# Altium schematic symbol library SCHLIB.SchLib: 2608 symbols (part 19 of 20) (continued)
## SW-AYZ0202AGRLC (continued)
SWITCH SLIDE DPDT 100MA 12V; Manufacturer: ITT C&K; Manufacturer Part Number: AYZ0202AGRLC; Mechanical Life: 10000Cycles; Actuator Material: Nylon,Glass,Polyamide,Glass fibre; Actuator Type: Standard; Illumination Type: Non-Illuminated; Contact Resistance: 80mR; Switch Function: On-On; Actuator Length: 1mm; Supplier 1: RSComponents; Supplier Part Number 1: 7931504; Stock: 377; Pricing: 1=1.326, 50=1.209, 100=1.105, 1000=1.027, 3000=0.962, 1=10.2, 50=9.3, 100=8.5, 1000=7.9, 3000=7.4 (EUR); RoHS: Yes; Mount: Surface Mount,PCB; Case/Package: 100; Contact Material: Copper Alloy,Brass,Silver; Housing Material: Glass; Contact Plating: Silver; Min Operating Temperature: -10°C; Max Operating Temperature: 60°C; Termination: Gull Wing; Throw Configuration: DPDT; Max Current Rating: 100mA; Max Voltage Rating (DC): 12V; Voltage Rating (DC): 12V; Package Quantity: 1; Packaging: Tape and Reel; Current Rating: 100mA; Contact Current Rating: 100mA; Orientation: Vertical; Length: 7.2mm; Depth: 6mm; Radiation Hardening: No; Lead Free: Lead Free; REACH SVHC: No SVHC; ComponentLink1URL: https://datasheet.ciiva.com/16417/ayz0202agrlc-16417120.pdf?src-supplier=Future+Electronics; ComponentLink1Description: https://datasheet.ciiva.com/16417/ayz0202agrlc-16417120.pdf?src-supplier=Future+Electronics; ComponentLink2URL: https://datasheet.ciiva.com/2889/ayz-16oct13-2889189.pdf?src-supplier=Digi-Key; ComponentLink2Description: https://datasheet.ciiva.com/2889/ayz-16oct13-2889189.pdf?src-supplier=Digi-Key; ComponentLink3URL: https://datasheet.ciiva.com/8624/ayz-16oct13-8624741.pdf?src-supplier=Avnet; ComponentLink3Description: https://datasheet.ciiva.com/8624/ayz-16oct13-8624741.pdf?src-supplier=Avnet; ComponentLink4URL: https://datasheet.ciiva.com/2889/ayz-16oct13-2889190.pdf?src-supplier=Digi-Key; ComponentLink4Description: https://datasheet.ciiva.com/2889/ayz-16oct13-2889190.pdf?src-supplier=Digi-Key; ComponentLink5URL: https://datasheet.ciiva.com/2889/ayz-16oct13-2889191.pdf?src-supplier=Digi-Key; ComponentLink5Description: https://datasheet.ciiva.com/2889/ayz-16oct13-2889191.pdf?src-supplier=Digi-Key; ComponentLink6URL: https://datasheet.ciiva.com/16174/ayz-24mar-16174248.pdf?src-supplier=Onlinecomponents.com; ComponentLink6Description: https://datasheet.ciiva.com/16174/ayz-24mar-16174248.pdf?src-supplier=Onlinecomponents.com; ComponentLink7URL: https://datasheet.ciiva.com/22630/1707705-22630555.pdf?src-supplier=Element14; ComponentLink7Description: https://datasheet.ciiva.com/22630/1707705-22630555.pdf?src-supplier=Element14
footprint SW-AYZ0202AGRLC
pins: 1, 2, 3, 4, 5, 6

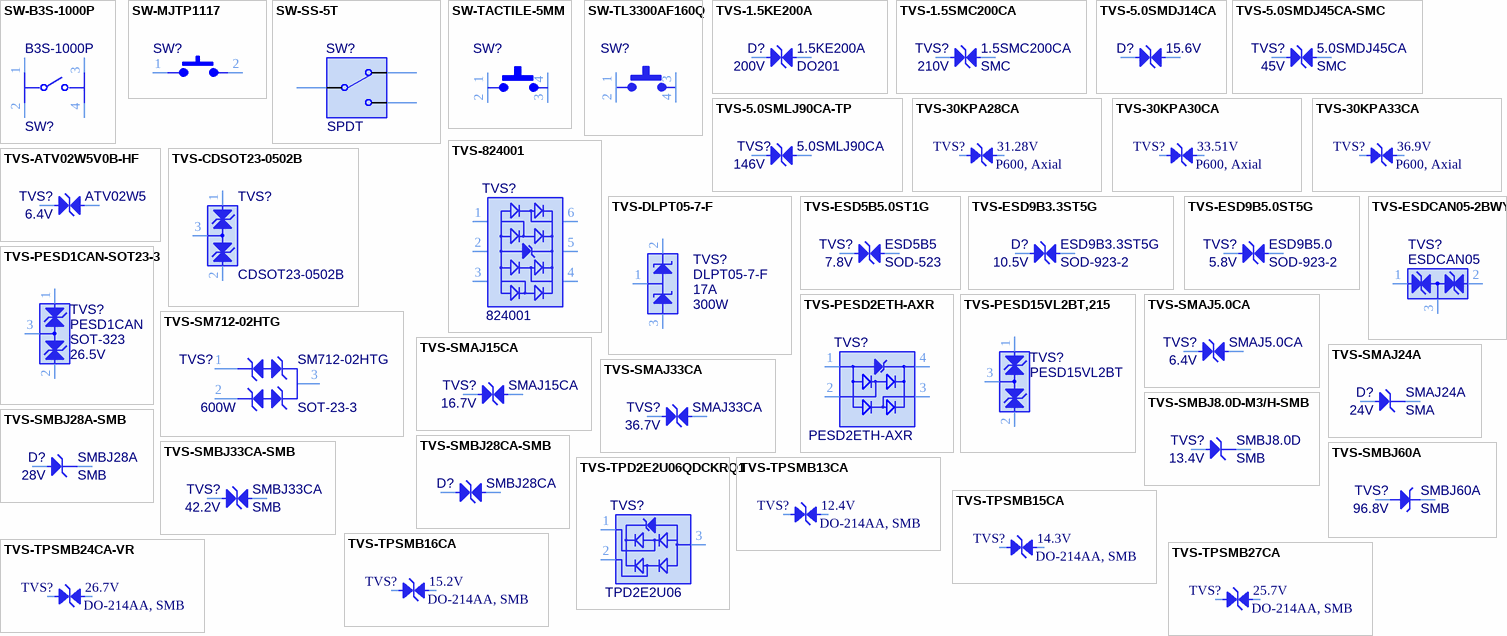
[diagram p82: symbols SW-B3S-1000P to TVS-TPSMB27CA]

## SW-B3S-1000P
designator SW?, comment B3S-1000P
SWITCH TACTILE SPST-NO 0.05A 24V; Manufacturer 1: Omron; Throw Configuration: SPST; Switch Function: Off-Mom; Switch Travel: 0.25mm; Contact Current Rating: 50mA; Actuator Length: 0.8mm; Mechanical Life: 500000Cycles; Contact Resistance: 100mR; Operating Force: 1.57N; Actuator Type: Standard; Illumination Type: Non-Illuminated; Ratings: IP67; Number of Poles: 1; Package Quantity: 1; Orientation: Straight; REACH SVHC: No SVHC; Lead Free: Lead Free; Max Current Rating: 50mA; Contact Plating: Silver; Current Rating: 50mA; Depth: 9mm; Contact Material: Bronze; Electrical Life: 500000Cycles; Termination: Gull Wing; Width: 6mm; Packaging: Tape and Reel; Min Operating Temperature: -25°C; Radiation Hardening: No; Max Voltage Rating (DC): 24V; Max Operating Temperature: 70°C; Length: 6.6mm; Height: 3.65mm; Voltage Rating (DC): 24V; Weight: 0.010582oz; Mount: Surface Mount; Supplier 1: Digi-Key; Manufacturer Part Number: B3S-1000P; Stock 1: 141614; Pricing 1: 1=0,65000, 10=0,63100, 25=0,60640, 100=0,52620, 250=0,48016, 500=0,44620 (USD); RoHS: Yes; ComponentLink1URL: https://datasheet.ciiva.com/2899/b3s-1110-2899873.pdf?src-supplier=Digi-Key; ComponentLink1Description: https://datasheet.ciiva.com/2899/b3s-1110-2899873.pdf?src-supplier=Digi-Key; ComponentLink2URL: https://datasheet.ciiva.com/2899/b3s-1110-2899874.pdf?src-supplier=Digi-Key; ComponentLink2Description: https://datasheet.ciiva.com/2899/b3s-1110-2899874.pdf?src-supplier=Digi-Key; ComponentLink3URL: https://datasheet.ciiva.com/2899/b3s-1110-2899875.pdf?src-supplier=Digi-Key; ComponentLink3Description: https://datasheet.ciiva.com/2899/b3s-1110-2899875.pdf?src-supplier=Digi-Key; ComponentLink4URL: https://datasheet.ciiva.com/15183/getdatasheetpartid-211358-15183771.pdf?src-supplier=Verical; ComponentLink4Description: https://datasheet.ciiva.com/15183/getdatasheetpartid-211358-15183771.pdf?src-supplier=Verical; ComponentLink5URL: https://datasheet.ciiva.com/27056/2086750-27056652.pdf?src-supplier=Jameco; ComponentLink5Description: https://datasheet.ciiva.com/27056/2086750-27056652.pdf?src-supplier=Jameco; ComponentLink6URL: https://datasheet.ciiva.com/16155/en-b3s-16155006.pdf?src-supplier=Onlinecomponents.com; ComponentLink6Description: https://datasheet.ciiva.com/16155/en-b3s-16155006.pdf?src-supplier=Onlinecomponents.com; ComponentLink7URL: https://datasheet.ciiva.com/30125/en-b3s-30125455.pdf?src-supplier=Onlinecomponents.com; ComponentLink7Description: https://datasheet.ciiva.com/30125/en-b3s-30125455.pdf?src-supplier=Onlinecomponents.com; Supplier Part Number 1: SW836CT-ND
footprint CON-FP-B3S-1000P-MFG
pins: 1, 2, 3, 4

## SW-MJTP1117
designator SW?  (value not drawn)
SWITCH TACTILE SPST-NO 0.05A 12V; Manufacturer: APEM; Manufacturer Part Number: MJTP1117; Mechanical Life: 100000Cycles; Actuator Material: Thermoplastic; Operating Force: 180gf; Throw Configuration: SPST; Contact Resistance: 100mR; Current Rating: 50mA; Illumination Type: Non-Illuminated; Switch Travel: 0.25mm; Switch Function: Off-Mom; Actuator Length: 1.45mm; Washability: OK; Supplier 1: Digi-Key; Stock 1: 34701; Pricing 1: 1=0.45, 50=0.4106, 100=0.3542, 500=0.3059, 1000=0.2415, 5000=0.2254 (USD); Mount: Through Hole; Contact Material: Bronze,Stainless Steel; Contact Plating: Silver; Min Operating Temperature: -20°C; Max Operating Temperature: 70°C; Package Quantity: 100; Packaging: Bulk; Voltage Rating (DC): 12V; Max Voltage Rating (DC): 12V; Termination: PC Pin; Electrical Life: 100000Cycles; Orientation: Right Angle; Supplier Part Number 1: 679-2400-ND
pins: 1, 2

## SW-SS-5T
designator SW?, comment SPDT
SWITCH SNAP ACTION SPDT 5A 125V; Manufacturer: Omron; Manufacturer Part Number: SS-5T; Mechanical Life: 30000000Cycles; Operating Force: 1.47N; Voltage Rating (DC): 30V; Max Voltage Rating (DC): 14V; Current Rating: 4A; Electrical Life: 200000Cycles; Number of Poles: 1; Pretravel: 0.02inch; Differential Travel: 0.004inch; Operating Position: 0.33inch; Switch Function: On-Mom; Ratings: IP40; Approvals: CSA,UL; Washability: OK; Supplier 1: Digi-Key; Supplier Part Number 1: SW141-ND; Stock 1: 4164; Pricing 1: 1=2.2, 10=2.035, 25=1.908, 50=1.8658, 100=1.4841, 250=1.39932, 500=1.3145, 1000=1.2297, 5000=1.14489 (USD); Mount: Chassis Mount,Screw; Case/Package: 125; Weight: 1.6g; Contact Material: Silver; Min Operating Temperature: -25°C; Max Operating Temperature: 85°C; Max Current Rating: 5A; Voltage Rating (AC): 125V; Max Voltage Rating (AC): 125V; Throw Configuration: SPDT; Package Quantity: 500; Contact Current Rating: 5A; Packaging: Bulk; Termination: Quick Connect; Orientation: Straight; Overtravel: 0.02inch; Length: 19.8mm; Depth: 6.4mm; REACH SVHC: Unknown; Lead Free: Lead Free; ComponentLink1URL: http://www.omron.com/ecb/products/pdf/en-ss.pdf?src-supplier=Digi-Key; ComponentLink1Description: http://www.omron.com/ecb/products/pdf/en-ss.pdf?src-supplier=Digi-Key; ComponentLink2URL: https://www.distrelec.biz/Web/Downloads/24/01/03572401.pdf?mime=application%2Fpdf&src-supplier=Distrelec; ComponentLink2Description: https://www.distrelec.biz/Web/Downloads/24/01/03572401.pdf?mime=application%2Fpdf&src-supplier=Distrelec; ComponentLink3URL: https://www.components.omron.com/components/web/pdflib.nsf/0/80FC48E7A8A557A885257201007DD493/$file/SS_1110.pdf?src-supplier=Avnet; ComponentLink3Description: https://www.components.omron.com/components/web/pdflib.nsf/0/80FC48E7A8A557A885257201007DD493/$file/SS_1110.pdf?src-supplier=Avnet; ComponentLink4URL: https://www.alliedelec.com/m/d/4bac659ac71603589768c71b5ea7cc57.pdf?src-supplier=Allied+Electronics; ComponentLink4Description: https://www.alliedelec.com/m/d/4bac659ac71603589768c71b5ea7cc57.pdf?src-supplier=Allied+Electronics
footprint SPDT-SS5T
pins: C COM, NC, NO

## SW-TACTILE-5MM
designator SW?
SWITCH TACTILE SPST-NO 0.05A 24V; Manufacturer: TE Connectivity AMP; Manufacturer Part Number: FSM4JSMA; Mechanical Life: 100000Cycles; Actuator Material: Polyamide; Operating Force: 1.57N; Throw Configuration: SPST; Max Voltage Rating (DC): 12V; Current Rating: 50mA; Illumination Type: Illuminated,Non-Illuminated; Contact Resistance: 100mR; Switch Travel: 0.25mm; Switch Function: Off-Mom; Actuator Type: Standard; Actuator Length: 0.055inch; Washability: OK; Supplier 1: Digi-Key; Stock 1: 31344; Pricing 1: 1=0.23, 10=0.218, 25=0.2108, 50=0.2032, 100=0.192, 250=0.18068, 500=0.17314, 1000=0.13174, 5000=0.10916 (USD); Mount: Surface Mount; Case/Package: SMA; Contact Material: Copper Alloy; Contact Plating: Silver; Min Operating Temperature: -35°C; Max Operating Temperature: 85°C; Voltage Rating (DC): 24V; Packaging: Loose Piece; Termination: Gull Wing; Orientation: Straight; Package Quantity: 750; Contact Current Rating: 50mA; Electrical Life: 100000Cycles; Voltage Rating: 24V; Type: Switch; Length: 6mm; Width: 6mm; REACH SVHC: Unknown; ComponentLink1URL: https://www.alliedelec.com/m/d/12a87fa7d0b178a96761783f66d58fa4.pdf; ComponentLink1Description: https://www.alliedelec.com/m/d/12a87fa7d0b178a96761783f66d58fa4.pdf; ComponentLink2URL: http://www.onlinecomponents.com/productFiles/mf-AO/eng_cat_1308390_0904_e3_e10_.pdf; ComponentLink2Description: http://www.onlinecomponents.com/productFiles/mf-AO/eng_cat_1308390_0904_e3_e10_.pdf; ComponentLink3URL: https://www.te.com/commerce/DocumentDelivery/DDEController?Action=srchrtrv&DocNm=1308111-1_SWITCHES_CORE_PROGRAM_CATALOG&DocType=CS&DocLang=English; ComponentLink3Description: https://www.te.com/commerce/DocumentDelivery/DDEController?Action=srchrtrv&DocNm=1308111-1_SWITCHES_CORE_PROGRAM_CATALOG&DocType=CS&DocLang=English; Supplier Part Number 1: 450-1129-ND
pins: 1, 2, 3, 4

## SW-TL3300AF160Q
designator SW?
SWITCH TACTILE SPST-NO 0.05A 12V; Manufacturer: E-Switch; Manufacturer Part Number: DTSMW-24R-Q-T/R; Mechanical Life: 200000Cycles; Switch Function: Off-Mom; Throw Configuration: SPST; Illumination Type: Non-Illuminated; Current Rating: 50mA; Operating Force: 160gf; Switch Travel: 0.35mm; Supplier 1: Digi-Key; Supplier Part Number 1: EG4902CT-ND; Stock: 6931; Pricing: 1=0.6, 10=0.582, 25=0.5604, 100=0.4851, 250=0.442 (USD); RoHS: Yes; Mount: Surface Mount; Case/Package: SMD/SMT; Contact Plating: Silver; Min Operating Temperature: -25°C; Max Operating Temperature: 70°C; Termination: Gull Wing; Package Quantity: 1; Packaging: Tape and Reel; Voltage Rating (DC): 12V; ComponentLink1URL: https://datasheet.ciiva.com/2900/n301106b-2900869.pdf?src-supplier=Digi-Key; ComponentLink1Description: https://datasheet.ciiva.com/2900/n301106b-2900869.pdf?src-supplier=Digi-Key; ComponentLink2URL: https://datasheet.ciiva.com/2900/n301106b-2900870.pdf?src-supplier=Digi-Key; ComponentLink2Description: https://datasheet.ciiva.com/2900/n301106b-2900870.pdf?src-supplier=Digi-Key; ComponentLink3URL: https://datasheet.ciiva.com/2900/n301106b-2900871.pdf?src-supplier=Digi-Key; ComponentLink3Description: https://datasheet.ciiva.com/2900/n301106b-2900871.pdf?src-supplier=Digi-Key
footprint TACTILE-TL3300
pins: 1, 2, 3, 4

## TVS-1.5KE200A
designator D?, comment 1.5KE200A  Package: DO201  Voltage Rating (DC): 200V
TVS DIODE 171VWM 353VC DO201; Manufacturer: STMicroelectronics; Max Surge Current: 1mA; Reverse Breakdown Voltage: 190V; Number of Elements: 1; Reverse Standoff Voltage: 171V; Clamping Voltage: 353V; Peak Pulse Power: 1.5kW; Peak Pulse Current: 28A; Leakage Current: 1uA; Power Line Protection: No; Direction: Unidirectional; Element Configuration: Single; Max Breakdown Voltage: 210V; Capacitance: 675pF; Washability: OK; Supplier 1: Digi-Key; Manufacturer Part Number: 1.5KE200A; Stock 1: 1803; Pricing 1: 1=0.71, 10=0.628, 100=0.4816 (USD); Mount: Through Hole; Number of Pins: 2; Min Operating Temperature: -65°C; Max Operating Temperature: 175°C; Package Quantity: 600; Packaging: Tape and Reel; Min Breakdown Voltage: 190V; Breakdown Voltage: 190V; Termination: Through Hole; Test Current: 1mA; Number of Unidirectional Channels: 1; Composition: Zener; Operating Supply Voltage: 171V; Max Reverse Leakage Current: 1uA; Max Power Dissipation: 1.5kW; Power Dissipation: 1.5kW; Diameter: 5.3mm; Length: 9.5mm; Height: 5.3mm; Width: 5.3mm; Radiation Hardening: No; Lead Free: Lead Free; REACH SVHC: No SVHC; ComponentLink1URL: http://www.farnell.com/datasheets/1689681.pdf; ComponentLink1Description: http://www.farnell.com/datasheets/1689681.pdf; ComponentLink2URL: https://www.verical.com/server-webapp/html/getDatasheet?partID=71673; ComponentLink2Description: https://www.verical.com/server-webapp/html/getDatasheet?partID=71673; ComponentLink3URL: http://www.st.com/content/ccc/resource/technical/document/datasheet/03/7a/4e/3b/96/c3/4e/37/CD00000663.pdf/files/CD00000663.pdf/jcr:content/translations/en.CD00000663.pdf; ComponentLink3Description: http://www.st.com/content/ccc/resource/technical/document/datasheet/03/7a/4e/3b/96/c3/4e/37/CD00000663.pdf/files/CD00000663.pdf/jcr:content/translations/en.CD00000663.pdf; ComponentLink4URL: http://www.st.com/web/en/resource/technical/document/datasheet/CD00000663.pdf; ComponentLink4Description: http://www.st.com/web/en/resource/technical/document/datasheet/CD00000663.pdf; ComponentLink5URL: http://www.alliedelec.com/images/products/datasheets/bm/STMICROELECTRONICS/70013809.pdf; ComponentLink5Description: http://www.alliedelec.com/images/products/datasheets/bm/STMICROELECTRONICS/70013809.pdf; ComponentLink6URL: http://www.produktinfo.conrad.com/datenblaetter/1100000-1199999/001184202-da-01-en-TRANSIL_1500W_200V_1_5KE200A_DO_201_STM.pdf; ComponentLink6Description: http://www.produktinfo.conrad.com/datenblaetter/1100000-1199999/001184202-da-01-en-TRANSIL_1500W_200V_1_5KE200A_DO_201_STM.pdf; Supplier Part Number 1: 497-6644-1-ND; Polarity: Unidirectional
footprint D-DO-201-H
pins: A, C

## TVS-1.5SMC200CA
designator TVS?, comment 1.5SMC200CA  Max Breakdown Voltage: 210V  Package: SMC
TVS DIODE 171V 274V DO214AB; Manufacturer: Littelfuse; Peak Pulse Power: 1.5kW; Peak Pulse Current: 5.5A; Polarity: Bidirectional; Min Breakdown Voltage: 190V; Number of Channels: 1; Test Current: 1mA; Power Line Protection: No; Leakage Current: 1uA; Voltage Rating (DC): 200V; Washability: OK; Supplier 1: Mouser; Manufacturer Part Number: 1.5SMC200CA; Stock 1: 2945; Pricing 1: 1=0,72000, 10=0,56300, 100=0,42700, 500=0,38400, 1000=0,29100, 3000=0,27500 (USD); RoHS: Yes; Mount: Surface Mount; Number of Pins: 2; Min Operating Temperature: -55°C; Max Operating Temperature: 150°C; Clamping Voltage: 274V; Packaging: Tape and Reel; Reverse Standoff Voltage: 171V; Breakdown Voltage: 190V; Package Quantity: 3000; Operating Supply Voltage: 171V; Max Surge Current: 5.5A; Direction: Bidirectional; Composition: Zener; Number of Bidirectional Channels: 1; Number of Elements: 1; Reverse Breakdown Voltage: 190V; Termination: SMD/SMT; Power Dissipation: 1.5kW; Length: 8.13mm; Height: 2.62mm; Width: 6.22mm; Lead Free: Lead Free; ComponentLink1URL: https://datasheet.ciiva.com/341/littelfuse-tvs-diode-1-5smc-datasheet-pdf-341221.pdf?src-supplier=Digi-Key; ComponentLink1Description: https://datasheet.ciiva.com/341/littelfuse-tvs-diode-1-5smc-datasheet-pdf-341221.pdf?src-supplier=Digi-Key; ComponentLink2URL: https://datasheet.ciiva.com/6574/littelfuse-tvs-diode-1-5smc-datasheet-pdf-6574613.pdf?src-supplier=Digi-Key; ComponentLink2Description: https://datasheet.ciiva.com/6574/littelfuse-tvs-diode-1-5smc-datasheet-pdf-6574613.pdf?src-supplier=Digi-Key; ComponentLink3URL: https://datasheet.ciiva.com/341/littelfuse-tvs-diode-1-5smc-datasheet-pdf-341222.pdf?src-supplier=Digi-Key; ComponentLink3Description: https://datasheet.ciiva.com/341/littelfuse-tvs-diode-1-5smc-datasheet-pdf-341222.pdf?src-supplier=Digi-Key; Supplier Part Number 1: 576-1.5SMC200CA
footprint D-SMC-DO214AB-CA
pins: A, C

## TVS-5.0SMDJ14CA
designator D?, comment Min Breakdown Voltage: 15.6V  (hidden comment: 5.0SMDJ14CA)
TVS DIODE 14V 23.2V DO214AB; Manufacturer: Littelfuse; Number of Bidirectional Channels: 1; Peak Pulse Power: 5kW; Power Line Protection: No; Peak Pulse Current: 216A; Polarity: Bidirectional; Test Current: 10mA; Leakage Current: 400uA; Washability: OK; Supplier 1: Digi-Key; Manufacturer Part Number: 5.0SMDJ14CA; Stock 1: 2844; Pricing 1: 1=1.90000, 10=1.70600, 25=1.60960, 100=1.25540, 250=1.22324, 500=1.06228, 1000=0.90132 (USD); RoHS: Yes; Mount: Surface Mount; Number of Pins: 2; Min Operating Temperature: -55°C; Max Operating Temperature: 150°C; Reverse Standoff Voltage: 14V; Clamping Voltage: 23.2V; Composition: Zener; Package Quantity: 1; Packaging: Tape and Reel; Operating Supply Voltage: 14V; Max Surge Current: 216A; Reverse Breakdown Voltage: 15.6V; Breakdown Voltage: 15.6V; Number of Channels: 1; Termination: SMD/SMT; Number of Elements: 1; Max Power Dissipation: 5kW; Lead Free: Lead Free; ComponentLink1URL: https://datasheet.ciiva.com/341/littelfuse-tvs-diode-5-0smdj-datasheet-pdf-341407.pdf?src-supplier=Digi-Key; ComponentLink1Description: https://datasheet.ciiva.com/341/littelfuse-tvs-diode-5-0smdj-datasheet-pdf-341407.pdf?src-supplier=Digi-Key; ComponentLink2URL: https://datasheet.ciiva.com/341/littelfuse-tvs-diode-5-0smdj-datasheet-pdf-341406.pdf?src-supplier=Digi-Key; ComponentLink2Description: https://datasheet.ciiva.com/341/littelfuse-tvs-diode-5-0smdj-datasheet-pdf-341406.pdf?src-supplier=Digi-Key; Supplier Part Number 1: F6610CT-ND
footprint D-SMC-DO214AB-CA
pins: A 2, C 1

## TVS-5.0SMDJ45CA-SMC
designator TVS?, comment 5.0SMDJ45CA  Reverse Standoff Voltage: 45V  Package / Case: SMC
TVS DIODE 45VWM 72.7VC SMD; Manufacturer: Littelfuse; Reverse Breakdown Voltage: 50V; Max Surge Current: 66.8A; Number of Bidirectional Channels: 1; Clamping Voltage: 72.7V; Peak Pulse Power: 5kW; Power Line Protection: No; Polarity: Bidirectional; Peak Pulse Current: 68.8A; Test Current: 1mA; Max Breakdown Voltage: 55.3V; Leakage Current: 5uA; Voltage Rating (DC): 28V; Direction: Unidirectional; Max Reverse Leakage Current: 1uA; Power Dissipation: 600W; Element Configuration: Single; Washability: OK; Supplier 1: Digi-Key; Supplier Part Number 1: F4124CT-ND; Manufacturer Part Number: 5.0SMDJ45CA; Stock 1: 12513; Pricing 1: 1=3.03, 10=2.735, 25=2.4416, 100=2.1976, 250=1.95336, 500=1.7092, 1000=1.4162 (USD); Mount: Surface Mount; Number of Pins: 2; Min Operating Temperature: -55°C; Max Operating Temperature: 150°C; Packaging: Tape and Reel; Package Quantity: 3000; Min Breakdown Voltage: 50V; Breakdown Voltage: 50V; Number of Channels: 1; Termination: SMD/SMT; Number of Elements: 1; Composition: Zener; REACH SVHC: Unknown; Lead Free: Lead Free; ComponentLink1URL: http://www.littelfuse.com/products/tvs-diodes/surface-mount/~/media/electronics/datasheets/tvs_diodes/littelfuse_tvs_diode_5_0smdj_datasheet.pdf.pdf; ComponentLink1Description: http://www.littelfuse.com/products/tvs-diodes/surface-mount/~/media/electronics/datasheets/tvs_diodes/littelfuse_tvs_diode_5_0smdj_datasheet.pdf.pdf; Case/Package: SMB; Number of Unidirectional Channels: 1; Max Power Dissipation: 600W; Current: 1mA; Voltage: 28V; Length: 4.57mm; Height: 2.237mm; Width: 3.94mm; Radiation Hardening: No; ComponentLink2URL: http://www.littelfuse.com/~/media/electronics/datasheets/tvs_diodes/littelfuse_tvs_diode_smbj_datasheet.pdf.pdf; ComponentLink2Description: http://www.littelfuse.com/~/media/electronics/datasheets/tvs_diodes/littelfuse_tvs_diode_smbj_datasheet.pdf.pdf; ComponentLink3URL: http://www.farnell.com/datasheets/13057.pdf; ComponentLink3Description: http://www.farnell.com/datasheets/13057.pdf; Weight: 0.00328oz; ComponentLink4URL: http://www.littelfuse.com/data/en/Data_Sheets/Littelfuse_TVS-Diode_SMBJ.pdf; ComponentLink4Description: http://www.littelfuse.com/data/en/Data_Sheets/Littelfuse_TVS-Diode_SMBJ.pdf; ComponentLink5URL: https://www.distrelec.biz/Web/Downloads/g_/ds/smbj_eng_ds.pdf?mime=application%2Fpdf; ComponentLink5Description: https://www.distrelec.biz/Web/Downloads/g_/ds/smbj_eng_ds.pdf?mime=application%2Fpdf; Operating Supply Voltage: 45V
footprint D-SMC-DO214AB-CA
pins: 1 I/O1, 2 I/O2

## TVS-5.0SMLJ90CA-TP
designator TVS?, comment 5.0SMLJ90CA  Clamping Voltage: 146V
TVS DIODE 90V 146V DO214AB; Manufacturer: MCC; Manufacturer Part Number: 5.0SMLJ90CA-TP; Max Surge Current: 34.3A; Number of Channels: 1; Polarity: Bidirectional; Breakdown Voltage: 111V; Peak Pulse Power: 5kW; Min Breakdown Voltage: 100V; Power Line Protection: No; Supplier 1: Digi-Key; Stock 1: 2842; Pricing 1: 1=1,71000, 10=1,45000, 100=1,10200, 500=0,95700, 1000=0,80040 (USD); RoHS: Yes; Mount: Surface Mount; Min Operating Temperature: -55°C; Max Operating Temperature: 175°C; Packaging: Tape and Reel; Package Quantity: 3000; Peak Pulse Current: 34.3A; Termination: SMD/SMT; Number of Bidirectional Channels: 1; Reverse Standoff Voltage: 90V; Resistor Type: Zener; ComponentLink1URL: http://www.mouser.com/ds/2/258/5.0SMLJ11A-5.0SMLJ170A(LSMC)-220449.pdf?src-supplier=Mouser; ComponentLink1Description: http://www.mouser.com/ds/2/258/5.0SMLJ11A-5.0SMLJ170A(LSMC)-220449.pdf?src-supplier=Mouser; ComponentLink2URL: http://www.mccsemi.com/up_pdf/5.0SMLJ11A-5.0SMLJ400A(LSMC)-J.pdf?src-supplier=Digi-Key; ComponentLink2Description: http://www.mccsemi.com/up_pdf/5.0SMLJ11A-5.0SMLJ400A(LSMC)-J.pdf?src-supplier=Digi-Key; Supplier Part Number 1: 5.0SMLJ90CA-TPMSCT-ND
footprint D-SMC-DO214AB
pins: A, C

## TVS-30KPA28CA
designator TVS?  Voltage - Breakdown (Min): 31.28V  Package: P600, Axial
TVS DIODE 28VWM 50VC P600; Manufacturer Part Number: 30KPA28CA; Manufacturer: Littelfuse Inc.; Bidirectional Channels: 1; Voltage - Reverse Standoff: 28V; Voltage - Clamping (Max) @ Ipp: 50V; Current - Peak Pulse (10/1000µs): 606A; Power - Peak Pulse: 30000W (30kW); Power Line Protection: No; Object  Type: Part; Design Item ID: TVS-30KPA28CA; Series: 30KPA; Type: Zener; Applications: General Purpose; Operating Temperature: -55°C ~ 175°C (TJ); Mounting Type: Through Hole; Category: Diode
footprint DO-204AP-P600
pins: A I/O1, C I/O2

## TVS-30KPA30CA
designator TVS?  Voltage - Breakdown (Min): 33.51V  Package: P600, Axial
TVS DIODE 30VWM 55.2VC P600; Manufacturer Part Number: 30KPA30CA; Manufacturer: Littelfuse Inc.; Bidirectional Channels: 1; Voltage - Reverse Standoff: 30V; Voltage - Clamping (Max) @ Ipp: 55.2V; Current - Peak Pulse (10/1000µs): 548.9A; Power - Peak Pulse: 30000W (30kW); Power Line Protection: No; Object  Type: Part; Design Item ID: TVS-30KPA30CA; Series: 30KPA; Type: Zener; Applications: General Purpose; Operating Temperature: -55°C ~ 175°C (TJ); Mounting Type: Through Hole; Category: Diode
footprint DO-204AP-P600
pins: A I/O1, C I/O2

## TVS-30KPA33CA
designator TVS?  Voltage - Breakdown (Min): 36.9V  Package: P600, Axial
TVS DIODE 33VWM 58.5VC P600; Manufacturer Part Number: 30KPA33CA; Manufacturer: Littelfuse Inc.; Bidirectional Channels: 1; Voltage - Reverse Standoff: 33V; Voltage - Clamping (Max) @ Ipp: 58.5V; Current - Peak Pulse (10/1000µs): 517.9A; Power - Peak Pulse: 30000W (30kW); Power Line Protection: No; Object  Type: Part; Design Item ID: TVS-30KPA33CA; Series: 30KPA; Type: Zener; Applications: General Purpose; Operating Temperature: -55°C ~ 175°C (TJ); Mounting Type: Through Hole; Category: Diode
footprint DO-204AP-P600
pins: A I/O1, C I/O2

## TVS-824001
designator TVS?, comment 824001
TVS DIODE 5V 9V SOT23-6L; Manufacturer: Wurth Electronics; Capacitance: 1pF; Direction: Unidirectional; Polarity: Bidirectional; Number of Bidirectional Channels: 4; Min Breakdown Voltage: 6.2V; Power Line Protection: Yes; Max Reverse Leakage Current: 2A; Test Current: 1mA; Max Surge Current: 5A; Operating Supply Voltage: 6V; Supplier 1: Digi-Key; Supplier Part Number 1: 732-4464-1-ND; Manufacturer Part Number: 824001; Stock: 1126; Pricing: 1=0.74, 10=0.706, 50=0.659, 100=0.612, 500=0.541 (USD); RoHS: Yes; Mount: Surface Mount; Case/Package: SOT-23; Number of Pins: 6; Min Operating Temperature: -55°C; Max Operating Temperature: 85°C; Package Quantity: 3000; Termination: SMD/SMT; Packaging: Tape and Reel; Working Voltage: 5V; Reverse Standoff Voltage: 5V; Clamping Voltage: 9V; ESD Protection: Yes; Max Breakdown Voltage: 6.2V; Breakdown Voltage: 6.2V; Number of Channels: 4; Peak Pulse Current: 5A; Length: 2.9mm; Height: 1.16mm; Width: 2.8mm; REACH SVHC: Unknown; Lead Free: Lead Free; ComponentLink1URL: https://datasheet.ciiva.com/22694/824001-22694065.pdf?src-supplier=Element14; ComponentLink1Description: https://datasheet.ciiva.com/22694/824001-22694065.pdf?src-supplier=Element14; ComponentLink2URL: https://datasheet.ciiva.com/15063/824001-15063556.pdf?src-supplier=Digi-Key; ComponentLink2Description: https://datasheet.ciiva.com/15063/824001-15063556.pdf?src-supplier=Digi-Key; ComponentLink3URL: https://datasheet.ciiva.com/15063/824001-15063557.pdf?src-supplier=Digi-Key; ComponentLink3Description: https://datasheet.ciiva.com/15063/824001-15063557.pdf?src-supplier=Digi-Key; ComponentLink4URL: https://datasheet.ciiva.com/15063/824001-15063558.pdf?src-supplier=Digi-Key; ComponentLink4Description: https://datasheet.ciiva.com/15063/824001-15063558.pdf?src-supplier=Digi-Key; ComponentLink5URL: https://datasheet.ciiva.com/1276/824001-1276087.pdf?src-supplier=Element14; ComponentLink5Description: https://datasheet.ciiva.com/1276/824001-1276087.pdf?src-supplier=Element14
footprint SOT23-6L
pins: 1 I/O1, 2 GND, 3 I/O2, 4 I/O3, 5 VDD, 6 I/O4

## TVS-ATV02W5V0B-HF
designator TVS?, comment ATV02W5  Min Breakdown Voltage: 6.4V
TVS DIODE 5V 9.2V SOD123; Manufacturer: Comchip; Manufacturer Part Number: ATV02W5V0B-HF; Number of Bidirectional Channels: 1; Peak Pulse Power: 200W; Power Line Protection: No; Peak Pulse Current: 21.74A; Washability: OK; Supplier 1: Digi-Key; Supplier Part Number 1: 641-1986-1-ND; Stock 1: 7901; Pricing 1: 1=0.37000, 10=0.30000, 25=0.27440, 100=0.17240, 250=0.17052, 500=0.15966, 1000=0.10856 (USD); RoHS: Yes; Mount: Surface Mount; Case/Package: SOD123F; Min Operating Temperature: -55°C; Max Operating Temperature: 150°C; Packaging: Tape and Reel; Reverse Standoff Voltage: 5V; Clamping Voltage: 9.2V; Package Quantity: 3000; Composition: Zener; ComponentLink1URL: http://www.mouser.com/ds/2/80/ATV02W-HF series RevB-769696.pdf?src-supplier=Mouser; ComponentLink1Description: http://www.mouser.com/ds/2/80/ATV02W-HF series RevB-769696.pdf?src-supplier=Mouser; ComponentLink2URL: http://www.comchiptech.com/cms/UserFiles/ATV02W-HF%20series%20RevA.pdf?src-supplier=Digi-Key; ComponentLink2Description: http://www.comchiptech.com/cms/UserFiles/ATV02W-HF%20series%20RevA.pdf?src-supplier=Digi-Key
pins: A, C

## TVS-CDSOT23-0502B
designator TVS?, comment CDSOT23-0502B
TVS DIODE 5V 9V SOT23-3L; Manufacturer 1: Bourns; Direction: Bidirectional; Max Surge Current: 8.5A; Number of Channels: 2; Breakdown Voltage: 6V; Power Line Protection: No; Leakage Current: 2.5uA; Element Configuration: Dual; Capacitance: 15pF; Washability: OK; Supplier 1: Digi-Key; Manufacturer Part Number 1: CDSOT23-0502B; Stock 1: 34895; Pricing 1: 1=0,63000, 10=0,54100, 25=0,50480, 100=0,37490, 250=0,35616, 500=0,29272, 1000=0,23793 (USD); RoHS: Yes; Mount: Surface Mount; Case/Package: SOT-23; Number of Pins: 3; Contact Plating: Tin,Matte; Min Operating Temperature: -55°C; Max Operating Temperature: 125°C; Package Quantity: 3000; Packaging: Tape and Reel; Polarity: Bidirectional; Reverse Standoff Voltage: 5V; Clamping Voltage: 9V; Termination: SMD/SMT; Min Breakdown Voltage: 6V; Peak Pulse Current: 8.5A; Composition: Zener; Working Voltage: 5V; Number of Bidirectional Channels: 2; Depth: 1.4mm; Radiation Hardening: No; REACH SVHC: No SVHC; ComponentLink1URL: https://datasheet.ciiva.com/11193/cdsot23-0502b-11193841.pdf?src-supplier=Avnet; ComponentLink1Description: https://datasheet.ciiva.com/11193/cdsot23-0502b-11193841.pdf?src-supplier=Avnet; ComponentLink2URL: https://datasheet.ciiva.com/4510/cdsot23-0502b-63869-4510207.pdf?src-supplier=Mouser; ComponentLink2Description: https://datasheet.ciiva.com/4510/cdsot23-0502b-63869-4510207.pdf?src-supplier=Mouser; Supplier Part Number 1: CDSOT23-0502BCT-ND
footprint SOT23-3
pins: 1 I/O1, 2 I/O2, 3 GND (power)

## TVS-DLPT05-7-F
designator TVS?, comment DLPT05-7-F  Max Power Dissipation: 300W  Max Surge Current: 17A
TVS DIODE 5VWM 9.8VC SOT23-3; Manufacturer 1: Diodes; Direction: Unidirectional; Clamping Voltage: 9.8V; Working Voltage: 5V; Capacitance: 1.9pF; Number of Elements: 1; Reverse Breakdown Voltage: 6V; Power Line Protection: Yes; Number of Channels: 2; Leakage Current: 20uA; Test Current: 1mA; Element Configuration: Single; Washability: OK; Supplier 1: Digi-Key; Manufacturer Part Number 1: DLPT05-7-F; Stock 1: 134366; Pricing 1: 1=0,38000, 10=0,28500, 100=0,13570, 500=0,12028, 1000=0,09360 (USD); RoHS: Yes; Mount: Surface Mount; Case/Package: SOT-23-3; Number of Pins: 3; Contact Plating: Tin,Matte; Min Operating Temperature: -55°C; Max Operating Temperature: 150°C; Package Quantity: 3000; Packaging: Tape and Reel; Number of Bidirectional Channels: 1; Reverse Standoff Voltage: 5V; Min Breakdown Voltage: 6V; Peak Pulse Power: 300W; Polarity: Unidirectional; Termination: SMD/SMT; Breakdown Voltage: 6V; Power Dissipation: 300W; Peak Pulse Current: 17A; ESD Protection: Yes; Max Reverse Leakage Current: 20uA; Voltage Rating (DC): 6V; Length: 1.3mm; Height: 1mm; Width: 2.9mm; Depth: 1.3mm; Radiation Hardening: No; REACH SVHC: No SVHC; Lead Free: Lead Free; ComponentLink1URL: https://datasheet.ciiva.com/334/ds30310-334816.pdf?src-supplier=Digi-Key; ComponentLink1Description: https://datasheet.ciiva.com/334/ds30310-334816.pdf?src-supplier=Digi-Key; ComponentLink2URL: https://datasheet.ciiva.com/15143/getdatasheetpartid-40673-15143067.pdf?src-supplier=Verical; ComponentLink2Description: https://datasheet.ciiva.com/15143/getdatasheetpartid-40673-15143067.pdf?src-supplier=Verical; ComponentLink3URL: https://datasheet.ciiva.com/11195/ds30310-11195403.pdf?src-supplier=Avnet; ComponentLink3Description: https://datasheet.ciiva.com/11195/ds30310-11195403.pdf?src-supplier=Avnet; ComponentLink4URL: https://datasheet.ciiva.com/25958/ds30310-25958015.pdf?src-supplier=Avnet+Europe; ComponentLink4Description: https://datasheet.ciiva.com/25958/ds30310-25958015.pdf?src-supplier=Avnet+Europe; ComponentLink5URL: https://datasheet.ciiva.com/16386/ds30310-16386443.pdf?src-supplier=Future+Electronics; ComponentLink5Description: https://datasheet.ciiva.com/16386/ds30310-16386443.pdf?src-supplier=Future+Electronics; ComponentLink6URL: https://datasheet.ciiva.com/11195/ds30310-11195276.pdf?src-supplier=Avnet; ComponentLink6Description: https://datasheet.ciiva.com/11195/ds30310-11195276.pdf?src-supplier=Avnet; Supplier Part Number 1: DLPT05-FDICT-ND
footprint SOT23-3
pins: 1 I/O, 2 VCC (power), 3 GND (power)

## TVS-ESD5B5.0ST1G
designator TVS?, comment ESD5B5  Case/Package: SOD-523  Breakdown Voltage: 7.8V
TVS DIODE 5V SOD523; Manufacturer: ON Semiconductor; Manufacturer Part Number: ESD5B5.0ST1G; Peak Pulse Power: 50W; Number of Bidirectional Channels: 1; Min Breakdown Voltage: 5.8V; Power Line Protection: No; Capacitance: 32pF; Direction: Bidirectional; ESD Protection: Yes; Test Current: 1mA; Max Reverse Leakage Current: 1uA; Max Power Dissipation: 200mW; Element Configuration: Single; Peak Pulse Current: 30A; Washability: OK; Supplier 1: Digi-Key; Supplier Part Number 1: ESD5B5.0ST1GOSCT-ND; Stock 1: 219011; Pricing 1: 1=0.24000, 10=0.20000, 100=0.08200, 500=0.06840, 1000=0.04753 (USD); RoHS: Yes; Number of Pins: 2; Contact Plating: Tin,Matte; Min Operating Temperature: -55°C; Max Operating Temperature: 150°C; Packaging: Tape and Reel; Reverse Standoff Voltage: 5V; Composition: Zener; Package Quantity: 1; Operating Supply Voltage: 5V; Number of Channels: 1; Polarity: Bidirectional; Termination: SMD/SMT; Max Breakdown Voltage: 7.8V; Working Voltage: 5V; Leakage Current: 1uA; Power Dissipation: 50W; Number of Lines: 1; Length: 1.2mm; Height: 0.7mm; Width: 0.9mm; Depth: 0.8mm; Radiation Hardening: No; Lead Free: Lead Free; REACH SVHC: No SVHC; Halogen Free: Halogen Free; ComponentLink1URL: https://datasheet.ciiva.com/339/esd5b5-0st1g-339772.pdf?src-supplier=Avnet; ComponentLink1Description: https://datasheet.ciiva.com/339/esd5b5-0st1g-339772.pdf?src-supplier=Avnet; ComponentLink2URL: https://datasheet.ciiva.com/339/esd5b5-0st1g-339772.pdf?src-supplier=Digi-Key; ComponentLink2Description: https://datasheet.ciiva.com/339/esd5b5-0st1g-339772.pdf?src-supplier=Digi-Key; ComponentLink3URL: https://datasheet.ciiva.com/4510/esd5b5-0st1g-241623-4510548.pdf?src-supplier=Mouser; ComponentLink3Description: https://datasheet.ciiva.com/4510/esd5b5-0st1g-241623-4510548.pdf?src-supplier=Mouser; ComponentLink4URL: https://datasheet.ciiva.com/22637/716649-22637178.pdf?src-supplier=Element14; ComponentLink4Description: https://datasheet.ciiva.com/22637/716649-22637178.pdf?src-supplier=Element14; ComponentLink5URL: https://datasheet.ciiva.com/339/esd5b5-0st1-d-339774.pdf?src-supplier=Digi-Key; ComponentLink5Description: https://datasheet.ciiva.com/339/esd5b5-0st1-d-339774.pdf?src-supplier=Digi-Key; ComponentLink6URL: https://datasheet.ciiva.com/339/esd5b5-0st1-d-339773.pdf?src-supplier=Digi-Key; ComponentLink6Description: https://datasheet.ciiva.com/339/esd5b5-0st1-d-339773.pdf?src-supplier=Digi-Key
footprint D-SOD523
pins: A, C

## TVS-ESD9B3.3ST5G
designator D?, comment ESD9B3.3ST5G  Clamping Voltage: 10.5V  Case/Package: SOD-923-2
TVS DIODE 3.3V 11.5V SOD923; Manufacturer: ON Semiconductor; Number of Bidirectional Channels: 1; Min Breakdown Voltage: 5V; Power Line Protection: No; Peak Pulse Current: 2A; Capacitance: 15pF; Direction: Bidirectional; Leakage Current: 1uA; Peak Pulse Power: 300mW; ESD Protection: Yes; Test Current: 1mA; Element Configuration: Single; Washability: OK; Supplier 1: Digi-Key; Manufacturer Part Number: ESD9B3.3ST5G; Stock 1: 364671; Pricing 1: 1=0.22, 10=0.201, 100=0.1094, 500=0.06732, 1000=0.0459 (USD); Number of Pins: 2; Contact Plating: Matte,Tin; Min Operating Temperature: -55°C; Max Operating Temperature: 150°C; Packaging: Tape and Reel; Reverse Standoff Voltage: 3.3V; Composition: Zener; Package Quantity: 1; Number of Elements: 1; Operating Supply Voltage: 3.3V; Reverse Breakdown Voltage: 5V; Breakdown Voltage: 5V; Number of Channels: 1; Polarity: Bidirectional; Termination: SMD/SMT; Working Voltage: 3.3V; Max Reverse Leakage Current: 1uA; Max Power Dissipation: 300mW; Number of Lines: 1; Length: 0.8mm; Height: 0.4mm; Depth: 0.6mm; Width: 0.65mm; Radiation Hardening: No; Lead Free: Lead Free; REACH SVHC: No SVHC; Halogen Free: Halogen Free; ComponentLink1URL: http://www.onsemi.cn/pub_link/Collateral/ESD9B-D.PDF?src-supplier=Digi-Key; ComponentLink1Description: http://www.onsemi.cn/pub_link/Collateral/ESD9B-D.PDF?src-supplier=Digi-Key; ComponentLink2URL: http://www.onsemi.com/pub/Collateral/ESD9B-D.PDF?src-supplier=Avnet+Europe; ComponentLink2Description: http://www.onsemi.com/pub/Collateral/ESD9B-D.PDF?src-supplier=Avnet+Europe; ComponentLink3URL: http://www.mouser.com/ds/2/308/ESD9B-D-479788.pdf?src-supplier=Mouser; ComponentLink3Description: http://www.mouser.com/ds/2/308/ESD9B-D-479788.pdf?src-supplier=Mouser; ComponentLink4URL: http://www.farnell.com/datasheets/1596367.pdf?src-supplier=Element14; ComponentLink4Description: http://www.farnell.com/datasheets/1596367.pdf?src-supplier=Element14; ComponentLink5URL: https://www.verical.com/server-webapp/html/getDatasheet?partID=292713&src-supplier=Verical; ComponentLink5Description: https://www.verical.com/server-webapp/html/getDatasheet?partID=292713&src-supplier=Verical; ComponentLink6URL: http://www.onsemi.com/pub/Collateral/ESD9B-D.PDF?src-supplier=Avnet; ComponentLink6Description: http://www.onsemi.com/pub/Collateral/ESD9B-D.PDF?src-supplier=Avnet; Supplier Part Number 1: ESD9B3.3ST5GOSDKR-ND
footprint D-SOD923
pins: A, C